# Altium footprint library CONN_W2B.PcbLib: 77 footprints (part 3 of 5)
Each footprint in its own frame and in the unit in brackets; x right, y up, seen from the top. Pads: shape width x height; smd on the part's side, far side on the other; paste and mask are expansions set on the pad; w line width, h text height; cw(c..) or ccw(c..) is an arc to the next point about the centre after c.
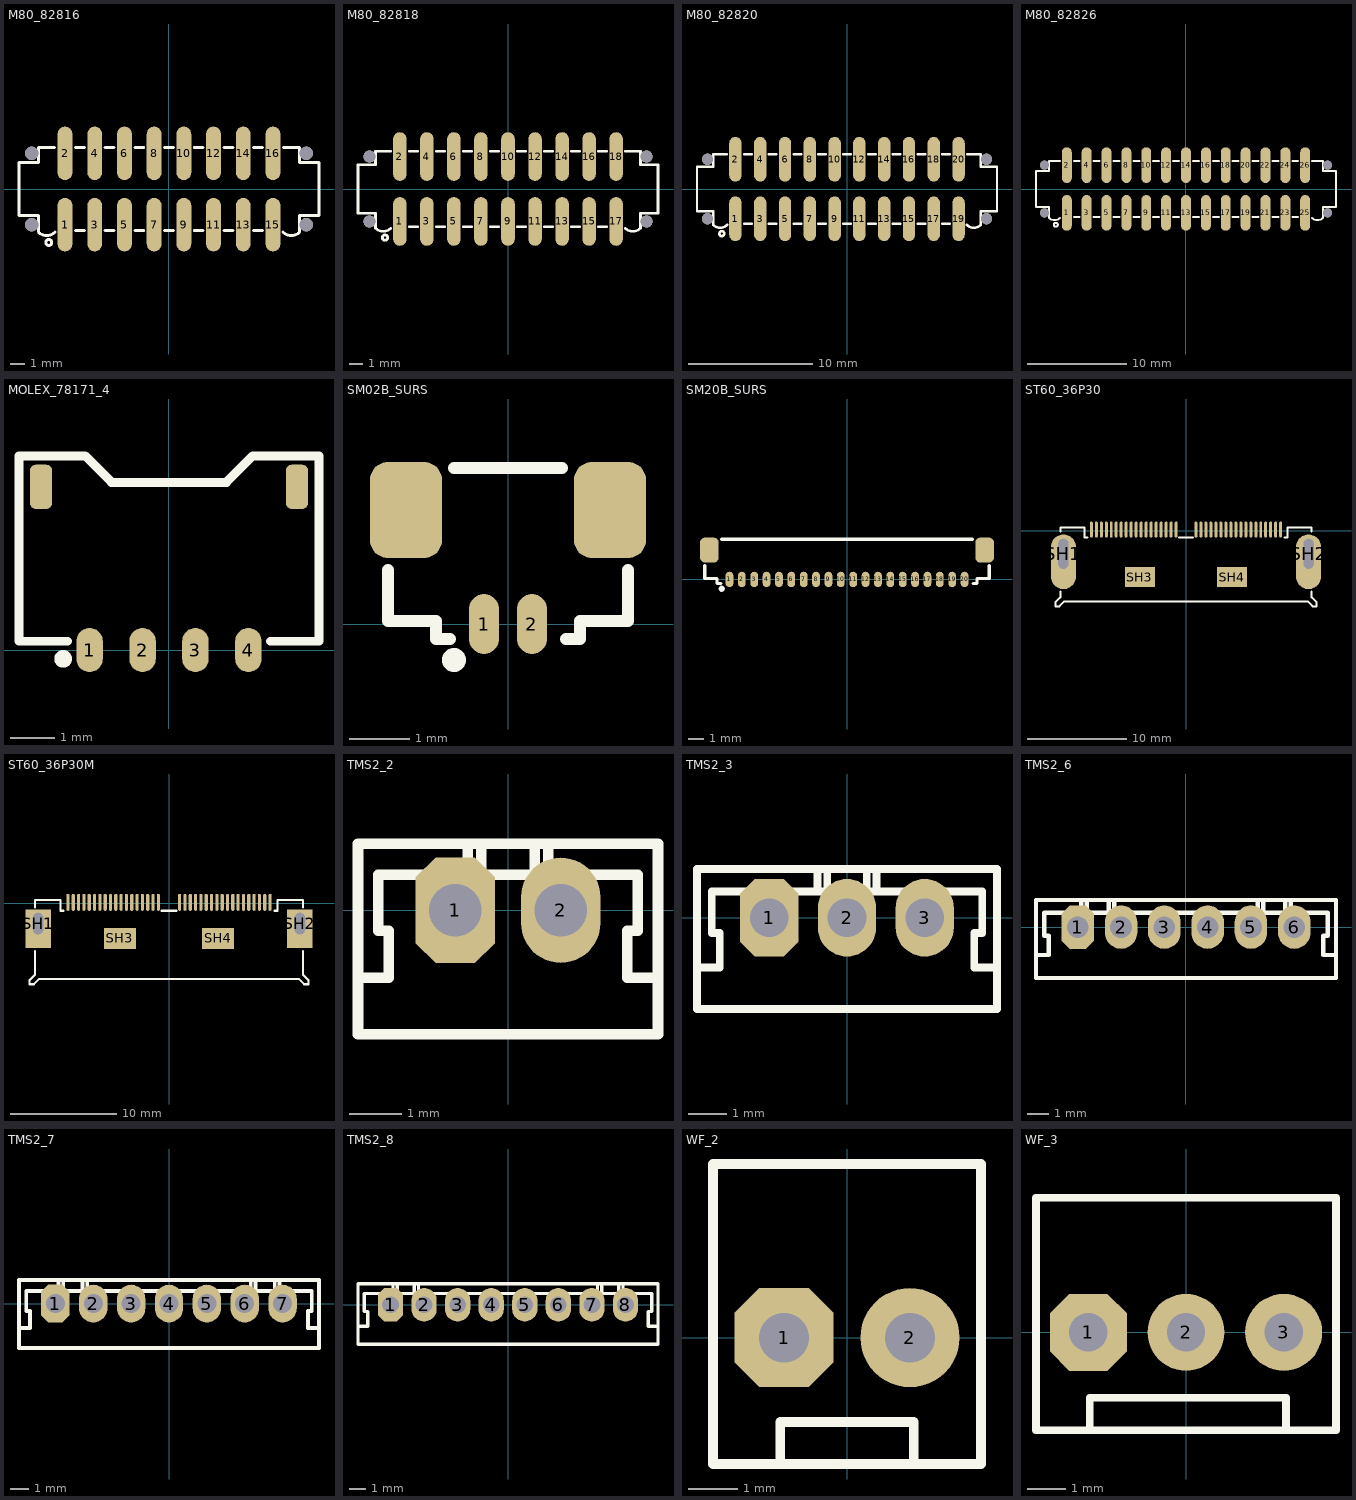
[diagram p2: the footprints below, top view; thin cyan lines are the x and y axes]

## M80_82816 [mm] "M80-8281642 Harwin Datamate 2mm Male"
pads (20):
  oval 1x3.6 smd: 1(-7,-2.4) 2(-7,2.4) 3(-5,-2.4) 4(-5,2.4) 5(-3,-2.4) 6(-3,2.4) 7(-1,-2.4) 8(-1,2.4) 9(1,-2.4) 10(1,2.4) 11(3,-2.4) 12(3,2.4) 13(5,-2.4) 14(5,2.4) 15(7,-2.4) 16(7,2.4)
  round 0.9 hole 0.9 unplated: ""(-9.25,-2.4) ""(-9.25,2.4) ""(9.25,-2.4) ""(9.25,2.4)
Top Overlay:
  circle w0.2: c-8.1,-3.6 r0.2
  lines w0.2: -7.7,2.8 -8.8,2.8 -8.8,1.8 -10.1,1.8 -10.1,-1.8 -8.8,-1.8 -8.8,-2.9 ccw(c-8.234,-2.334) -7.669,-2.9 ; -6.3,-2.8 -5.7,-2.8 ; -6.3,2.8 -5.7,2.8 ; -4.3,-2.8 -3.7,-2.8 ; -4.3,2.8 -3.7,2.8 ; -2.3,-2.8 -1.7,-2.8 ; -2.3,2.8 -1.7,2.8 ; -0.3,-2.8 0.3,-2.8 ; -0.3,2.8 0.3,2.8 ; 1.7,-2.8 2.3,-2.8 ; 1.7,2.8 2.3,2.8 ; 3.7,-2.8 4.3,-2.8 ; 3.7,2.8 4.3,2.8 ; 5.7,-2.8 6.3,-2.8 ; 5.7,2.8 6.3,2.8 ; 7.669,-2.9 ccw(c8.234,-2.334) 8.8,-2.9 8.8,-1.8 10.1,-1.8 10.1,1.8 8.8,1.8 8.8,2.8 7.7,2.8
3D body "m80-8281642_asm.stp": height 9, standoff 0.04, extent -9.95,-3.781 9.95,3.781

## M80_82818 [mm] "M80-8281842 Harwin Datamate 2mm Male"
pads (22):
  oval 1x3.6 smd: 1(-8,-2.4) 2(-8,2.4) 3(-6,-2.4) 4(-6,2.4) 5(-4,-2.4) 6(-4,2.4) 7(-2,-2.4) 8(-2,2.4) 9(0,-2.4) 10(0,2.4) 11(2,-2.4) 12(2,2.4) 13(4,-2.4) 14(4,2.4) 15(6,-2.4) 16(6,2.4) 17(8,-2.4) 18(8,2.4)
  round 0.9 hole 0.9 unplated: ""(-10.25,-2.4) ""(-10.25,2.4) ""(10.25,-2.4) ""(10.25,2.4)
Top Overlay:
  circle w0.2: c-9.1,-3.6 r0.2
  lines w0.2: -8.7,2.8 -9.8,2.8 -9.8,1.8 -11.1,1.8 -11.1,-1.8 -9.8,-1.8 -9.8,-2.9 ccw(c-9.234,-2.334) -8.669,-2.9 ; -7.3,-2.8 -6.7,-2.8 ; -7.3,2.8 -6.7,2.8 ; -5.3,-2.8 -4.7,-2.8 ; -5.3,2.8 -4.7,2.8 ; -3.3,-2.8 -2.7,-2.8 ; -3.3,2.8 -2.7,2.8 ; -1.3,-2.8 -0.7,-2.8 ; -1.3,2.8 -0.7,2.8 ; 0.7,-2.8 1.3,-2.8 ; 0.7,2.8 1.3,2.8 ; 2.7,-2.8 3.3,-2.8 ; 2.7,2.8 3.3,2.8 ; 4.7,-2.8 5.3,-2.8 ; 4.7,2.8 5.3,2.8 ; 6.7,-2.8 7.3,-2.8 ; 6.7,2.8 7.3,2.8 ; 8.669,-2.9 ccw(c9.234,-2.334) 9.8,-2.9 9.8,-1.8 11.1,-1.8 11.1,1.8 9.8,1.8 9.8,2.8 8.7,2.8
3D body "m80-8281842_asm.stp": height 9, standoff 0.04, extent -10.95,-3.781 10.95,3.781

## M80_82820 [mm] "M80-8282042 Harwin Datamate 2mm Male"
pads (24):
  oval 1x3.6 smd: 1(-9,-2.4) 2(-9,2.4) 3(-7,-2.4) 4(-7,2.4) 5(-5,-2.4) 6(-5,2.4) 7(-3,-2.4) 8(-3,2.4) 9(-1,-2.4) 10(-1,2.4) 11(1,-2.4) 12(1,2.4) 13(3,-2.4) 14(3,2.4) 15(5,-2.4) 16(5,2.4) 17(7,-2.4) 18(7,2.4) 19(9,-2.4) 20(9,2.4)
  round 0.9 hole 0.9 unplated: ""(-11.25,-2.4) ""(-11.25,2.4) ""(11.25,-2.4) ""(11.25,2.4)
Top Overlay:
  circle w0.2: c-10.1,-3.6 r0.2
  lines w0.2: -9.7,2.8 -10.8,2.8 -10.8,1.8 -12.1,1.8 -12.1,-1.8 -10.8,-1.8 -10.8,-2.9 ccw(c-10.234,-2.334) -9.669,-2.9 ; -8.3,-2.8 -7.7,-2.8 ; -8.3,2.8 -7.7,2.8 ; -6.3,-2.8 -5.7,-2.8 ; -6.3,2.8 -5.7,2.8 ; -4.3,-2.8 -3.7,-2.8 ; -4.3,2.8 -3.7,2.8 ; -2.3,-2.8 -1.7,-2.8 ; -2.3,2.8 -1.7,2.8 ; -0.3,-2.8 0.3,-2.8 ; -0.3,2.8 0.3,2.8 ; 1.7,-2.8 2.3,-2.8 ; 1.7,2.8 2.3,2.8 ; 3.7,-2.8 4.3,-2.8 ; 3.7,2.8 4.3,2.8 ; 5.7,-2.8 6.3,-2.8 ; 5.7,2.8 6.3,2.8 ; 7.7,-2.8 8.3,-2.8 ; 7.7,2.8 8.3,2.8 ; 9.669,-2.9 ccw(c10.234,-2.334) 10.8,-2.9 10.8,-1.8 12.1,-1.8 12.1,1.8 10.8,1.8 10.8,2.8 9.7,2.8
3D body "m80-8282042_asm.stp": height 9, standoff 0.04, extent -11.95,-3.781 11.95,3.781

## M80_82826 [mm] "M80-8282642 Harwin Datamate 2mm Male"
pads (30):
  oval 1x3.6 smd: 1(-12,-2.4) 2(-12,2.4) 3(-10,-2.4) 4(-10,2.4) 5(-8,-2.4) 6(-8,2.4) 7(-6,-2.4) 8(-6,2.4) 9(-4,-2.4) 10(-4,2.4) 11(-2,-2.4) 12(-2,2.4) 13(0,-2.4) 14(0,2.4) 15(2,-2.4) 16(2,2.4) 17(4,-2.4) 18(4,2.4) 19(6,-2.4) 20(6,2.4) 21(8,-2.4) 22(8,2.4) 23(10,-2.4) 24(10,2.4) 25(12,-2.4) 26(12,2.4)
  round 0.9 hole 0.9 unplated: ""(-14.25,-2.4) ""(-14.25,2.4) ""(14.25,-2.4) ""(14.25,2.4)
Top Overlay:
  circle w0.2: c-13.1,-3.6 r0.2
  lines w0.2: -12.7,2.8 -13.8,2.8 -13.8,1.8 -15.1,1.8 -15.1,-1.8 -13.8,-1.8 -13.8,-2.9 ccw(c-13.234,-2.334) -12.669,-2.9 ; -11.3,-2.8 -10.7,-2.8 ; -11.3,2.8 -10.7,2.8 ; -9.3,-2.8 -8.7,-2.8 ; -9.3,2.8 -8.7,2.8 ; -7.3,-2.8 -6.7,-2.8 ; -7.3,2.8 -6.7,2.8 ; -5.3,-2.8 -4.7,-2.8 ; -5.3,2.8 -4.7,2.8 ; -3.3,-2.8 -2.7,-2.8 ; -3.3,2.8 -2.7,2.8 ; -1.3,-2.8 -0.7,-2.8 ; -1.3,2.8 -0.7,2.8 ; 0.7,-2.8 1.3,-2.8 ; 0.7,2.8 1.3,2.8 ; 2.7,-2.8 3.3,-2.8 ; 2.7,2.8 3.3,2.8 ; 4.7,-2.8 5.3,-2.8 ; 4.7,2.8 5.3,2.8 ; 6.7,-2.8 7.3,-2.8 ; 6.7,2.8 7.3,2.8 ; 8.7,-2.8 9.3,-2.8 ; 8.7,2.8 9.3,2.8 ; 10.7,-2.8 11.3,-2.8 ; 10.7,2.8 11.3,2.8 ; 12.669,-2.9 ccw(c13.234,-2.334) 13.8,-2.9 13.8,-1.8 15.1,-1.8 15.1,1.8 13.8,1.8 13.8,2.8 12.7,2.8
3D body "m80-8282642_asm.stp": height 9, standoff 0.04, extent -14.95,-3.781 14.95,3.781

## MOLEX_78171_4 [mm] "PicoEZmate, Pitch: 1.2mm"
height 4
pads (6):
  oval 0.6x1 smd mask+0.075: 1(-1.8,0) 2(-0.6,0) 3(0.6,0) 4(1.8,0)
  rrect50% 0.5x1 smd: ""(-2.9,3.7) ""(2.9,3.7)
Top Overlay:
  circle w0.2: c-2.4,-0.2 r0.1
  lines w0.2: -2.3,0.2 -3.4,0.2 -3.4,4.4 -1.9,4.4 -1.3,3.8 1.3,3.8 1.9,4.4 3.4,4.4 3.4,0.2 2.3,0.2
3D body "781710004.stp": height 1.45, standoff 0, extent -3.3,-0.2 3.3,4.33

## SM02B_SURS [mm] "eSUR, Pitch: 0.8mm, side Entry"
height 1.75
pads (4):
  oval 0.5x1 smd mask+0.075: 1(-0.4,0) 2(0.4,0)
  rrect50% 1.2x1.6 smd: ""(-1.7,1.9) ""(1.7,1.9)
Top Overlay:
  circle w0.2: c-0.9,-0.6 r0.1
  lines w0.2: -2,0.9 -2,0.05 -1.2,0.05 -1.2,-0.25 -0.963,-0.25 ; -0.9,2.6 0.9,2.6 ; 0.963,-0.25 1.2,-0.25 1.2,0.05 2,0.05 2,0.9
3D body "SM02B-SURS-TF.STEP": height 1.75, standoff 0, extent -1.9,-0.2 1.9,2.5

## SM20B_SURS [mm] "eSUR, Pitch: 0.8mm, side Entry"
height 1.75
pads (22):
  oval 0.5x1 smd mask+0.075: 1(-7.6,0) 2(-6.8,0) 3(-6,0) 4(-5.2,0) 5(-4.4,0) 6(-3.6,0) 7(-2.8,0) 8(-2,0) 9(-1.2,0) 10(-0.4,0) 11(0.4,0) 12(1.2,0) 13(2,0) 14(2.8,0) 15(3.6,0) 16(4.4,0) 17(5.2,0) 18(6,0) 19(6.8,0) 20(7.6,0)
  rrect50% 1.2x1.6 smd: ""(-8.9,1.9) ""(8.9,1.9)
Top Overlay:
  circle w0.2: c-8.1,-0.6 r0.1
  lines w0.2: -9.2,0.9 -9.2,0.05 -8.4,0.05 -8.4,-0.25 -8.163,-0.25 ; -8.1,2.6 8.1,2.6 ; 8.163,-0.25 8.4,-0.25 8.4,0.05 9.2,0.05 9.2,0.9
3D body "SM20B-SURS-TF.STEP": height 1.75, standoff 0, extent -9.1,-0.2 9.1,2.5

## ST60_36P30 [mm] "ST60-36P(30) HIROSE, 0.5mm pitch"
height 4.06
pads (40):
  oval 0.3x1.6 smd mask+0.05: 1(-9.5,0.1) 2(-9,0.1) 3(-8.5,0.1) 4(-8,0.1) 5(-7.5,0.1) 6(-7,0.1) 7(-6.5,0.1) 8(-6,0.1) 9(-5.5,0.1) 10(-5,0.1) 11(-4.5,0.1) 12(-4,0.1) 13(-3.5,0.1) 14(-3,0.1) 15(-2.5,0.1) 16(-2,0.1) 17(-1.5,0.1) 18(-1,0.1) 19(1,0.1) 20(1.5,0.1) 21(2,0.1) 22(2.5,0.1) 23(3,0.1) 24(3.5,0.1) 25(4,0.1) 26(4.5,0.1) 27(5,0.1) 28(5.5,0.1) 29(6,0.1) 30(6.5,0.1) 31(7,0.1) 32(7.5,0.1) 33(8,0.1) 34(8.5,0.1) 35(9,0.1) 36(9.5,0.1)
  oval 2.5x5.5 hole 1 slot 3 at 90 deg copper offset 0,-0.8: SH1(-12.3,-2.325) SH2(12.3,-2.325)
  rect 3x2 smd: SH3(-4.625,-4.675) SH4(4.625,-4.675)
Top Overlay:
  lines w0.2: -12.6,-6.1 -12.6,-6.7 -13.1,-7.2 -13.1,-7.6 -12.7,-7.6 -12.2,-7.1 12.2,-7.1 12.7,-7.6 13.1,-7.6 13.1,-7.2 12.6,-6.7 12.6,-6.1 ; -12.6,-0.1 -12.6,0.3 -10.2,0.3 -10.2,-0.7 -9.9,-0.7 ; -0.7,-0.7 0.7,-0.7 ; 9.9,-0.7 10.2,-0.7 10.2,0.3 12.6,0.3 ; 12.6,0.3 12.6,-0.1 12.6,0.3
3D body "ST60-36P.stp": height 3.63, standoff -0.67, extent -13,-7.44 13.009,0.64

## ST60_36P30M [mm] "ST60-36P(30) HIROSE, 0.5mm pitch modified"
height 4.06
pads (40):
  oval 0.3x1.6 smd mask+0.05: 1(-9.5,0.1) 2(-9,0.1) 3(-8.5,0.1) 4(-8,0.1) 5(-7.5,0.1) 6(-7,0.1) 7(-6.5,0.1) 8(-6,0.1) 9(-5.5,0.1) 10(-5,0.1) 11(-4.5,0.1) 12(-4,0.1) 13(-3.5,0.1) 14(-3,0.1) 15(-2.5,0.1) 16(-2,0.1) 17(-1.5,0.1) 18(-1,0.1) 19(1,0.1) 20(1.5,0.1) 21(2,0.1) 22(2.5,0.1) 23(3,0.1) 24(3.5,0.1) 25(4,0.1) 26(4.5,0.1) 27(5,0.1) 28(5.5,0.1) 29(6,0.1) 30(6.5,0.1) 31(7,0.1) 32(7.5,0.1) 33(8,0.1) 34(8.5,0.1) 35(9,0.1) 36(9.5,0.1)
  rect 2.4x3.6 hole 1 slot 2 at 90 deg copper offset 0,-0.5: SH1(-12.3,-1.9) SH2(12.3,-1.9)
  rect 3x2 smd: SH3(-4.625,-3.3) SH4(4.625,-3.3)
Top Overlay:
  lines w0.2: -12.6,-4.5 -12.6,-6.7 -13.1,-7.2 -13.1,-7.6 -12.7,-7.6 -12.2,-7.1 12.2,-7.1 12.7,-7.6 13.1,-7.6 13.1,-7.2 12.6,-6.7 12.6,-4.5 ; -12.6,-0.4 -12.6,0.3 -10.2,0.3 -10.2,-0.7 -9.9,-0.7 ; -0.7,-0.7 0.7,-0.7 ; 9.9,-0.7 10.2,-0.7 10.2,0.3 12.6,0.3 12.6,-0.4
3D body "ST60-36P.stp": height 3.63, standoff -0.67, extent -13,-7.44 13.009,0.64

## TMS2_2 [mm] "pitch: 2.0mm"
pads (2):
  oct 1.5x2 hole 1: 1(-1,0)
  oval 1.5x2 hole 1: 2(1,0)
Top Overlay:
  lines w0.2: -2.845,-1.283 -2.261,-1.283 -2.261,-0.394 -2.464,-0.394 -2.464,0.673 2.464,0.673 2.464,-0.394 2.261,-0.394 2.261,-1.283 2.845,-1.283 ; -0.762,0.673 -0.762,1.257 ; -0.508,0.673 -0.508,1.257 ; 0.508,0.673 0.508,1.257 ; 0.762,0.673 0.762,1.257 ; -2.845,-2.35 -2.845,1.257 2.845,1.257 2.845,-2.35 -2.845,-2.35

## TMS2_3 [mm] "pitch: 2.0mm"
pads (3):
  oct 1.5x2 hole 1: 1(-2,0)
  oval 1.5x2 hole 1: 2(0,0) 3(2,0)
Top Overlay:
  lines w0.2: -3.861,-1.283 -3.277,-1.283 -3.277,-0.394 -3.48,-0.394 -3.48,0.673 3.48,0.673 3.48,-0.394 3.277,-0.394 3.277,-1.283 3.861,-1.283 ; -0.762,0.673 -0.762,1.257 ; -0.508,0.673 -0.508,1.257 ; 0.508,0.673 0.508,1.257 ; 0.762,0.673 0.762,1.257 ; -3.861,-2.35 3.861,-2.35 3.861,1.257 -3.861,1.257 -3.861,-2.35

## TMS2_6 [mm] "pitch: 2.0mm"
pads (6):
  oct 1.5x2 hole 1: 1(-5,0)
  oval 1.5x2 hole 1: 2(-3,0) 3(-1,0) 4(1,0) 5(3,0) 6(5,0)
Top Overlay:
  lines w0.2: -6.925,-1.283 -6.341,-1.283 -6.341,-0.394 -6.544,-0.394 -6.544,0.673 6.544,0.673 6.544,-0.394 6.341,-0.394 6.341,-1.283 6.925,-1.283 ; -4.842,0.673 -4.842,1.257 ; -4.588,0.673 -4.588,1.257 ; -3.572,0.673 -3.572,1.257 ; -3.318,0.673 -3.318,1.257 ; 3.318,0.673 3.318,1.257 ; 3.572,0.673 3.572,1.257 ; 4.588,0.673 4.588,1.257 ; 4.842,0.673 4.842,1.257 ; -6.925,-2.35 6.925,-2.35 6.925,1.257 -6.925,1.257 -6.925,-2.35

## TMS2_7 [mm] "pitch: 2.0mm"
pads (7):
  oct 1.5x2 hole 1: 1(-6,0)
  oval 1.5x2 hole 1: 2(-4,0) 3(-2,0) 4(0,0) 5(2,0) 6(4,0) 7(6,0)
Top Overlay:
  lines w0.2: -7.925,-1.283 -7.341,-1.283 -7.341,-0.394 -7.544,-0.394 -7.544,0.673 7.544,0.673 7.544,-0.394 7.341,-0.394 7.341,-1.283 7.925,-1.283 ; -5.842,0.673 -5.842,1.257 ; -5.588,0.673 -5.588,1.257 ; -4.572,0.673 -4.572,1.257 ; -4.318,0.673 -4.318,1.257 ; 4.318,0.673 4.318,1.257 ; 4.572,0.673 4.572,1.257 ; 5.588,0.673 5.588,1.257 ; 5.842,0.673 5.842,1.257 ; -7.925,-2.35 7.925,-2.35 7.925,1.257 -7.925,1.257 -7.925,-2.35

## TMS2_8 [mm] "pitch: 2.0mm"
pads (8):
  oct 1.5x2 hole 1: 1(-7,0)
  oval 1.5x2 hole 1: 2(-5,0) 3(-3,0) 4(-1,0) 5(1,0) 6(3,0) 7(5,0) 8(7,0)
Top Overlay:
  lines w0.2: -8.941,-1.283 -8.357,-1.283 -8.357,-0.394 -8.56,-0.394 -8.56,0.673 8.56,0.673 8.56,-0.394 8.357,-0.394 8.357,-1.283 8.941,-1.283 ; -6.858,0.673 -6.858,1.257 ; -6.604,0.673 -6.604,1.257 ; -5.588,0.673 -5.588,1.257 ; -5.334,0.673 -5.334,1.257 ; 5.334,0.673 5.334,1.257 ; 5.588,0.673 5.588,1.257 ; 6.604,0.673 6.604,1.257 ; 6.858,0.673 6.858,1.257 ; -8.941,-2.35 -8.941,1.257 8.941,1.257 8.941,-2.35 -8.941,-2.35

## WF_2 [mm] "DS1070  WF, Cvilux CI31 pitch 2.54mm"
pads (2):
  oct 2x2 hole 1: 1(-1.27,0)
  round 2 hole 1: 2(1.27,0)
Top Overlay:
  lines w0.2: -1.346,-2.548 -1.346,-1.7 1.346,-1.7 1.346,-2.548 ; -2.7,-2.548 2.7,-2.548 2.7,3.5 -2.7,3.5 -2.7,-2.548
3D body "User Library-CI31_2.step": height 11.56, standoff -3.24, extent -2.54,-2.402 2.54,3.398

## WF_3 [mm] "DS1070  WF, Cvilux CI31 pitch 2.54mm"
pads (3):
  oct 2x2 hole 1: 1(-2.54,0)
  round 2 hole 1: 2(0,0) 3(2.54,0)
Top Overlay:
  lines w0.2: -2.5,-2.548 -2.5,-1.7 2.6,-1.7 2.6,-2.548 ; -3.9,-2.548 3.9,-2.548 3.9,3.5 -3.9,3.5 -3.9,-2.548
3D body "User Library-CI31_3.step": height 11.56, standoff -3.24, extent -3.81,-2.4 3.81,3.4